# Altium footprint library FujinLib.PcbLib: 106 footprints (part 4 of 7)
Each footprint in its own frame and in the unit in brackets; x right, y up, seen from the top. Pads: shape width x height; smd on the part's side, far side on the other; paste and mask are expansions set on the pad; w line width, h text height; cw(c..) or ccw(c..) is an arc to the next point about the centre after c.
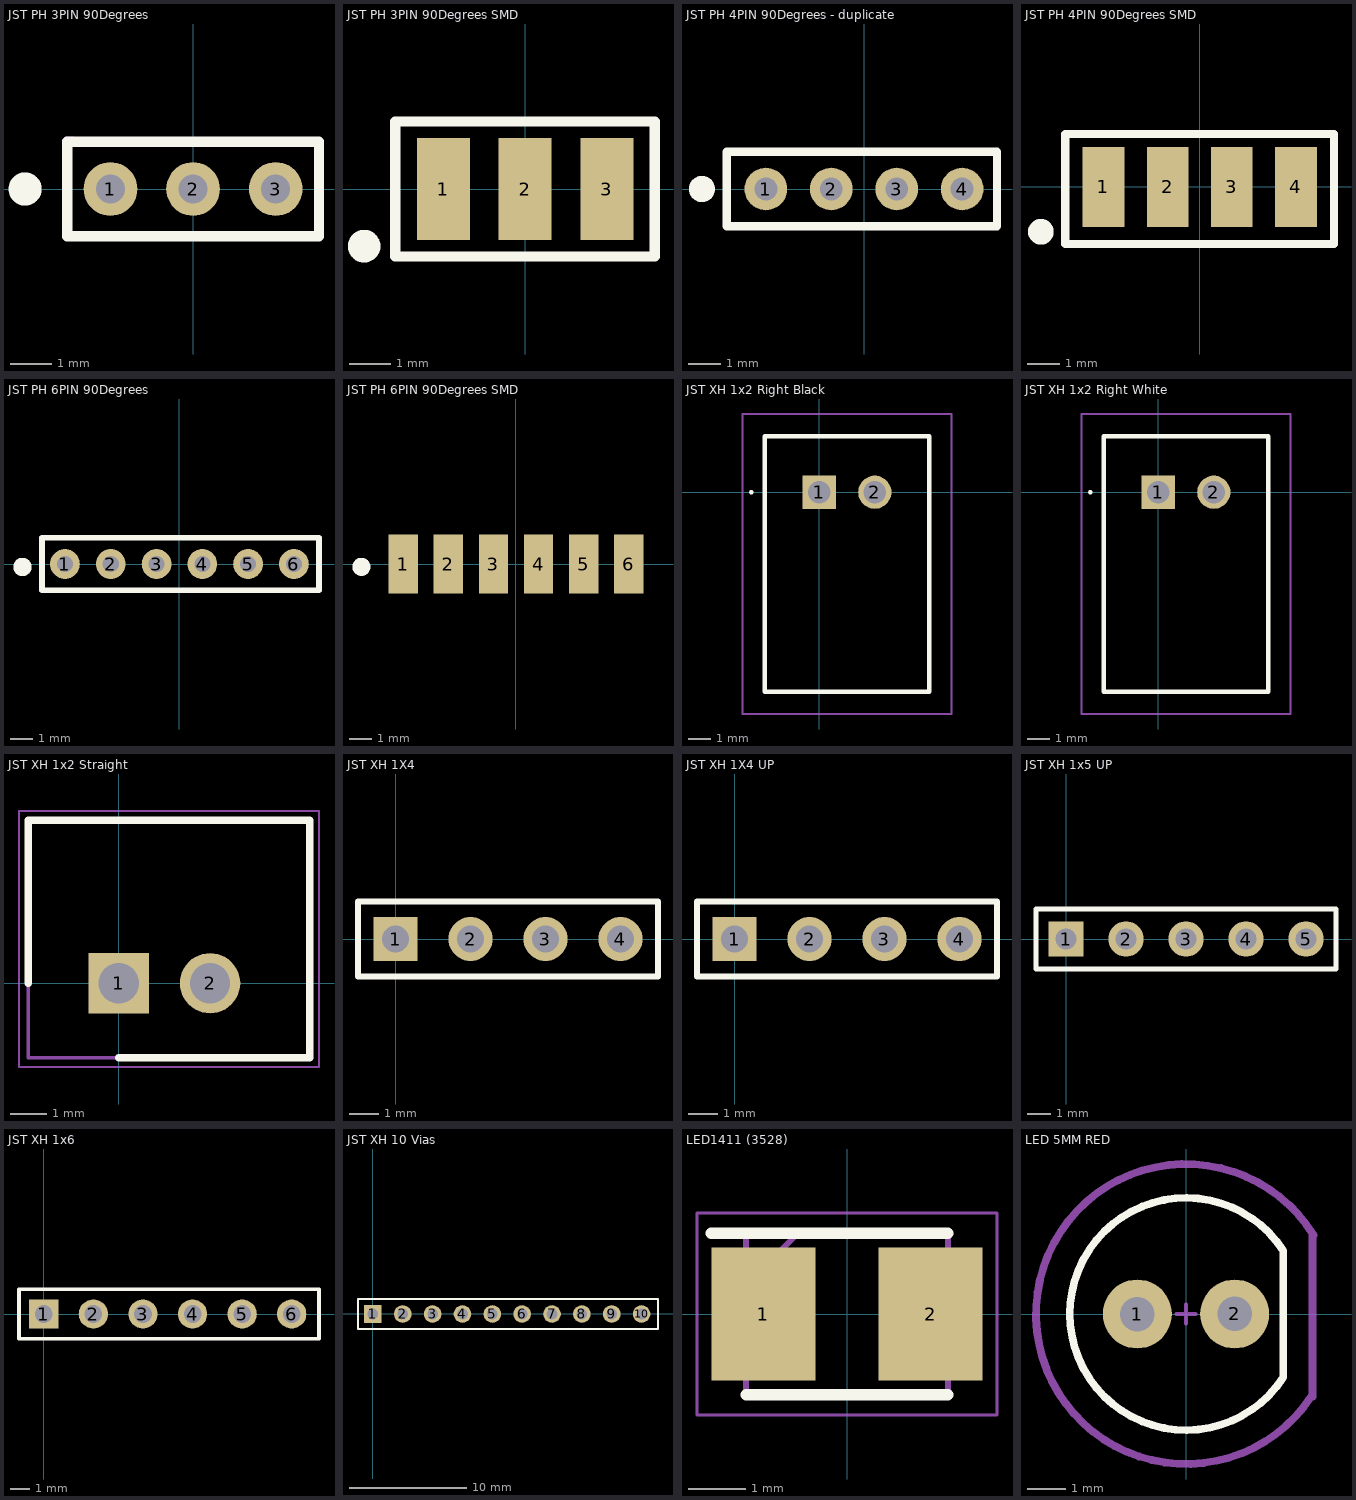
[diagram p3: the footprints below, top view; thin cyan lines are the x and y axes]

## JST PH 3PIN 90Degrees [mm]
pads (3):
  round 1.3 hole 0.7: 1(-2,0) 2(0,0) 3(2,0)
Top Overlay:
  circle w0.5: c-4.064,0 r0.15
  lines w0.254: -3.048,-1.143 3.048,-1.143 3.048,1.143 -3.048,1.143 -3.048,-1.143
Mechanical 1:
  lines w0.254: -3.048,1.143 -2.921,1.143
3D body "JST - PH - SMD (R) - 3Pin - 2.00mm.stp": height 5.38, standoff 0, extent -5.067,-6.54 5.08,1.714

## JST PH 3PIN 90Degrees SMD [mm]
pads (3):
  rect 1.3x2.5 smd: 1(-2,0) 2(0,0) 3(2,0)
Top Overlay:
  circle w0.5: c-3.937,-1.397 r0.15
  lines w0.254: -3.175,-1.651 3.175,-1.651 3.175,1.651 -3.175,1.651 -3.175,-1.651
3D body "JST - PH - SMD (R) - 3Pin - 2.00mm.stp": height 5.38, standoff 0, extent -5.073,-7.493 5.073,0.762

## JST PH 4PIN 90Degrees - duplicate [mm]
pads (4):
  round 1.3 hole 0.7: 1(-3,0) 2(-1,0) 3(1,0) 4(3,0)
Top Overlay:
  circle w0.5: c-4.953,0 r0.15
  lines w0.254: -4.191,-1.143 4.064,-1.143 4.064,1.143 -4.191,1.143 -4.191,-1.143
3D body "JST - PH - SMD (R) - 4Pin - 2.00mm.stp": height 5.38, standoff 0, extent -6.073,-6.35 6.073,1.905

## JST PH 4PIN 90Degrees SMD [mm]
pads (4):
  rect 1.3x2.5 smd: 1(-3,0) 2(-1,0) 3(1,0) 4(3,0)
Top Overlay:
  circle w0.5: c-4.953,-1.397 r0.15
  lines w0.254: -4.191,-1.778 -4.191,1.651 4.191,1.651 4.191,-1.778 -4.191,-1.778
3D body "JST - PH - SMD (R) - 4Pin - 2.00mm.stp": height 5.38, standoff 0, extent -6.073,-7.493 6.073,0.762

## JST PH 6PIN 90Degrees [mm]
pads (6):
  round 1.3 hole 0.7: 1(-5,0) 2(-3,0) 3(-1,0) 4(1,0) 5(3,0) 6(5,0)
Top Overlay:
  circle w0.5: c-6.858,-0.127 r0.15
  lines w0.254: -6,-1.143 -6,1.143 6.096,1.143 6.096,-1.143 -6,-1.143
3D body "JST - PH - SMD (R) - 6Pin - 2.00mm.stp": height 5.38, standoff 0, extent -8.073,-6.604 8.073,1.651

## JST PH 6PIN 90Degrees SMD [mm]
pads (6):
  rect 1.3x2.6 smd: 1(-5,0) 2(-3,0) 3(-1,0) 4(1,0) 5(3,0) 6(5,0)
Top Overlay:
  circle w0.5: c-6.858,-0.127 r0.15
3D body "JST - PH - SMD (R) - 6Pin - 2.00mm.stp": height 5.38, standoff 0, extent -8.073,-7.493 8.073,0.762

## JST XH 1x2 Right Black [mm]
pads (2):
  rect 1.5x1.5 hole 1: 1(0,0)
  round 1.5 hole 1: 2(2.5,0)
Top Overlay:
  lines w0.1: -3.1,0 cw(c-3.05,0) -3,0 cw(c-3.05,0) -3.1,0
  lines w0.2: -2.45,-8.98 4.95,-8.98 4.95,2.52 -2.45,2.52 -2.45,-8.98
Mechanical 13:
  lines w0.1: -2.45,-8.98 4.95,-8.98 4.95,2.52 -2.45,2.52 -2.45,-8.98
Mechanical 15:
  lines w0.1: -3.45,-9.98 5.95,-9.98 5.95,3.52 -3.45,3.52 -3.45,-9.98
3D body "53426-9021.stp": height 6.2, standoff -4, extent -2.45,-8.98 4.95,2.52

## JST XH 1x2 Right White [mm]
pads (2):
  rect 1.5x1.5 hole 1: 1(0,0)
  round 1.5 hole 1: 2(2.5,0)
Top Overlay:
  lines w0.1: -3.1,0 cw(c-3.05,0) -3,0 cw(c-3.05,0) -3.1,0
  lines w0.2: -2.45,-8.98 4.95,-8.98 4.95,2.52 -2.45,2.52 -2.45,-8.98
Mechanical 13:
  lines w0.1: -2.45,-8.98 4.95,-8.98 4.95,2.52 -2.45,2.52 -2.45,-8.98
Mechanical 15:
  lines w0.1: -3.45,-9.98 5.95,-9.98 5.95,3.52 -3.45,3.52 -3.45,-9.98
3D body "53426-9020.stp": height 6.75, standoff -3.35, extent -2.43,-9.024 4.97,2.476

## JST XH 1x2 Straight [mm]
pads (2):
  rect 1.65x1.65 hole 1.1: 1(0,0)
  round 1.65 hole 1.1: 2(2.5,0)
Top Overlay:
  lines w0.2: -2.48,0 -2.48,4.46 5.23,4.46 5.23,-2.04 0,-2.04
Mechanical 13:
  lines w0.1: -2.48,-2.04 -2.48,4.46 5.23,4.46 5.23,-2.04 -2.48,-2.04
Mechanical 15:
  lines w0.05: -2.73,-2.29 -2.73,4.71 5.48,4.71 5.48,-2.29 -2.73,-2.29
3D body "35312-0260.stp": height 7, standoff -3.4, extent -2.44,-2.61 5.02,3.89

## JST XH 1X4 [mm]
pads (4):
  rect 1.5x1.5 hole 0.9: 1(0,0)
  round 1.5 hole 0.9: 2(2.54,0) 3(5.08,0) 4(7.62,0)
Top Overlay:
  lines w0.2: -1.27,-1.27 -1.27,1.27 8.89,1.27 8.89,-1.27 -1.27,-1.27
3D body "JST - XH - Thru (R) - 4Pin - 2.54mm.stp": height 5.84, standoff -3.38, extent -2.337,-7.661 9.957,0.376

## JST XH 1X4 UP [mm]
pads (4):
  rect 1.5x1.5 hole 0.9: 1(0,0)
  round 1.5 hole 0.9: 2(2.54,0) 3(5.08,0) 4(7.62,0)
Top Overlay:
  lines w0.2: -1.27,-1.27 8.89,-1.27 8.89,1.27 -1.27,1.27 -1.27,-1.27
3D body "User Library-jst-b4b-xh-a-1.step": height 7, standoff -3.4, extent -2.39,-3.383 10.01,2.367

## JST XH 1x5 UP [mm]
pads (5):
  rect 1.5x1.5 hole 0.9: 1(0,0)
  round 1.5 hole 0.9: 2(2.54,0) 3(5.08,0) 4(7.62,0) 5(10.16,0)
Top Overlay:
  lines w0.2: -1.27,-1.27 11.43,-1.27 11.43,1.27 -1.27,1.27 -1.27,-1.27
3D body "User Library-jst-b4b-xh-a.step": height 7, standoff -3.4, extent -2.37,-3.429 12.53,2.321

## JST XH 1x6 [mm]
pads (6):
  rect 1.5x1.5 hole 0.9: 1(0,0)
  round 1.5 hole 0.9: 2(2.54,0) 3(5.08,0) 4(7.62,0) 5(10.16,0) 6(12.7,0)
Top Overlay:
  lines w0.2: -1.27,-1.27 -1.27,1.27 14.097,1.27 14.097,-1.27 -1.27,-1.27
3D body "JST - XH - Thru (R) - 6Pin - 2.54mm.stp": height 5.84, standoff -3.38, extent -2.337,-7.661 15.037,0.376

## JST XH 10 Vias [mm]
pads (10):
  rect 1.5x1.5 hole 0.9: 1(0,0)
  round 1.5 hole 0.9: 2(2.54,0) 3(5.08,0) 4(7.62,0) 5(10.16,0) 6(12.7,0) 7(15.24,0) 8(17.78,0) 9(20.32,0) 10(22.86,0)
Top Overlay:
  lines w0.2: -1.27,-1.27 11.557,-1.27 24.257,-1.27 24.257,1.27 11.557,1.27 -1.27,1.27 -1.27,-1.27
3D body "JST - XH - Thru (R) - 10Pin - 2.54mm.stp": height 5.84, standoff -3.38, extent -2.367,-7.661 25.167,0.376

## LED1411 (3528) [mm]
pads (2):
  rect 1.8x2.3 smd: 1(-1.45,0) 2(1.45,0)
Top Overlay:
  lines w0.2: -2.35,1.4 1.75,1.4 ; -1.75,-1.4 1.75,-1.4
Mechanical 13:
  lines w0.1: -1.75,0.5 -0.85,1.4 ; -1.75,-1.4 -1.75,1.4 1.75,1.4 1.75,-1.4 -1.75,-1.4
Mechanical 15:
  lines w0.05: -2.6,-1.75 -2.6,1.75 2.6,1.75 2.6,-1.75 -2.6,-1.75
3D body "User Library-Led_3528_SingleColor.step": height 1.9, standoff 0, extent -1.75,-1.4 1.75,1.4

## LED 5MM RED [mm]
pads (2):
  round 1.8 hole 0.9: 1(-1.27,0) 2(1.27,0)
Top Overlay:
  lines w0.2: 2.54,-1.651 cw(c0,0) 2.54,1.651 2.54,-1.651
Mechanical 15:
  lines w0.1: -0.254,0 0.254,0 ; 0,-0.254 0,0.254
  lines w0.2: 3.275,-2.141 cw(c0,0) 3.333,2.051 ; 3.302,-2.159 3.302,2.032
Mechanical 29:
  text "K" at 0.635,-1.524 h0.5
  text "A" at -1.143,-1.524 h0.5
3D body "ALSRobot-LED Red 5mm.STEP": height 9.31, standoff -5.49, extent -2.98,-3.01 2.44,3.01